# Altium footprint library ESKDPcbLib.PcbLib: 608 footprints (part 3 of 38)
Each footprint in its own frame and in the unit in brackets; x right, y up, seen from the top. Pads: shape width x height; smd on the part's side, far side on the other; paste and mask are expansions set on the pad; w line width, h text height; cw(c..) or ccw(c..) is an arc to the next point about the centre after c.
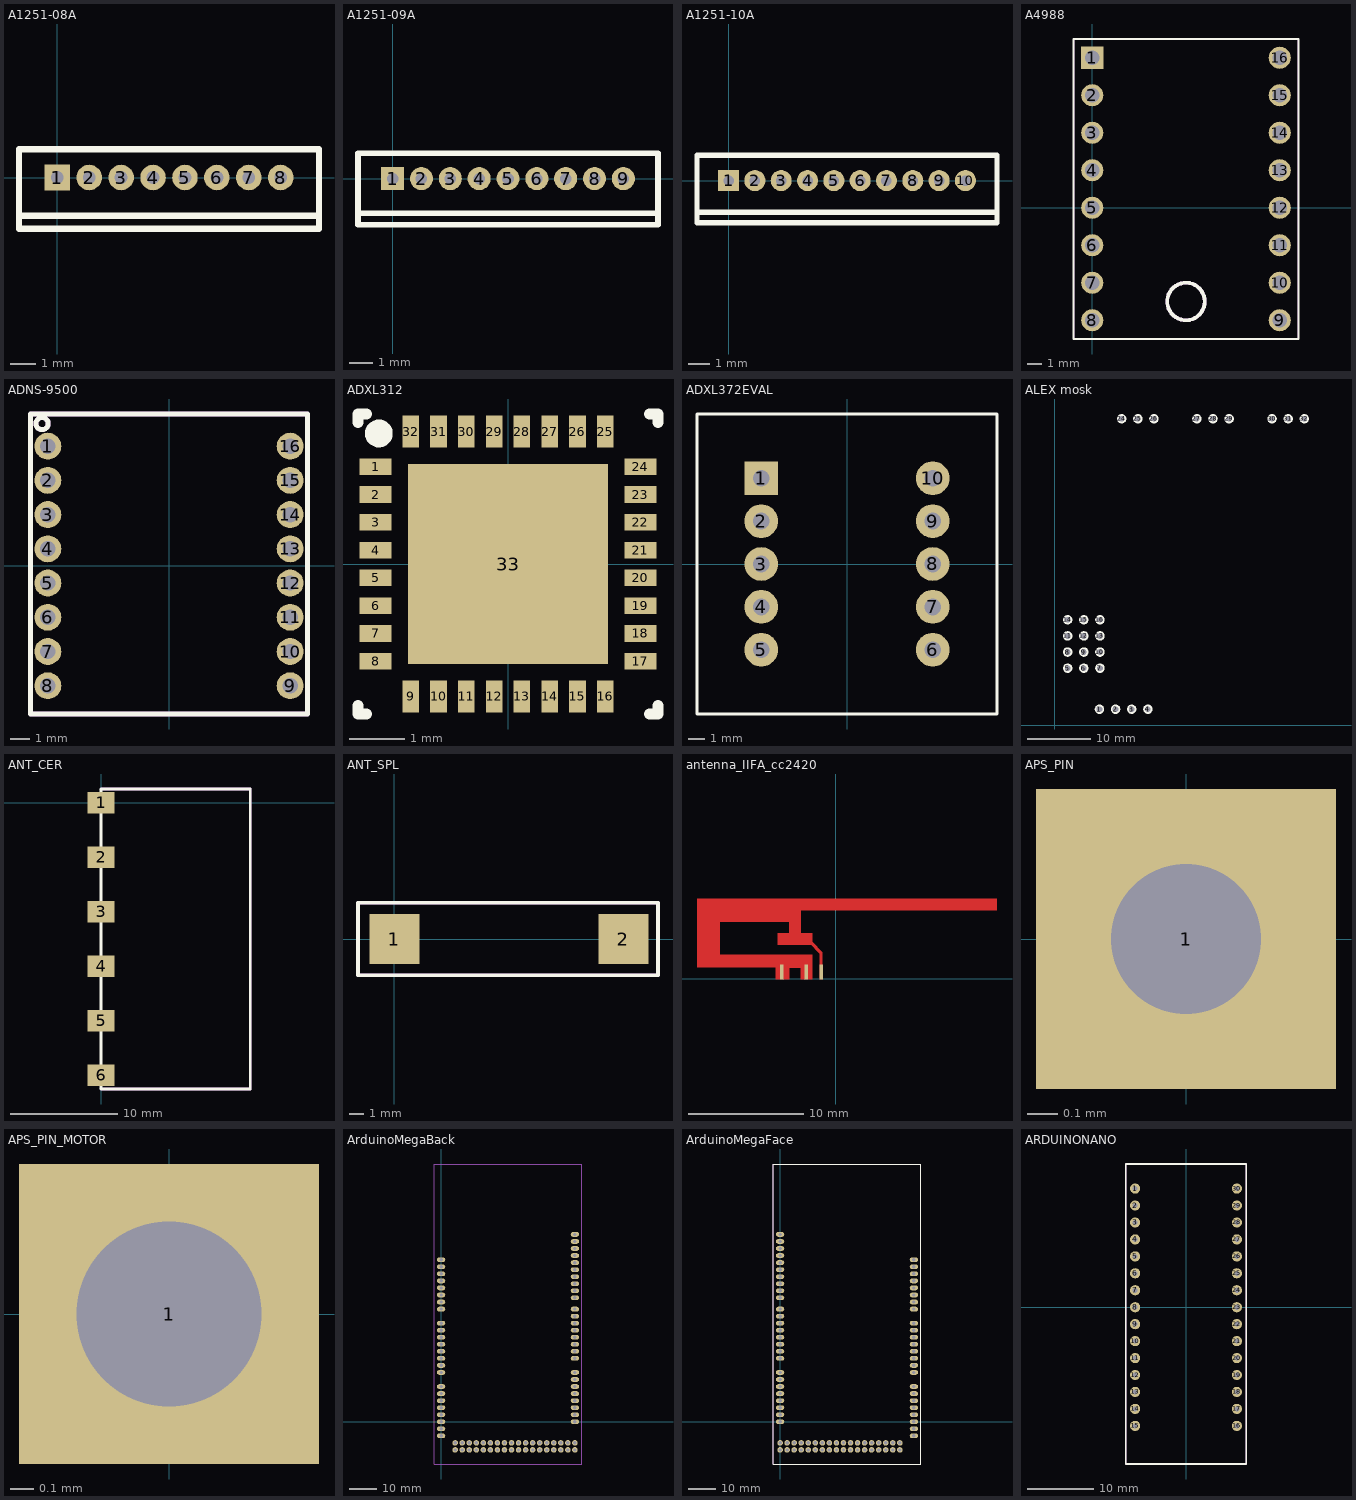
[diagram p2: the footprints below, top view; thin cyan lines are the x and y axes]

## A1251-08A [mm]
pads (8):
  rect 1x1 hole 0.5 mask+0: 1(0,0)
  round 1 hole 0.5 mask+0: 2(1.25,0) 3(2.5,0) 4(3.75,0) 5(5,0) 6(6.25,0) 7(7.5,0) 8(8.75,0)
Top Overlay:
  lines w0.254: -1.5,-1.5 10.2,-1.5 ; -1.5,-2 -1.5,1.1 10.25,1.1 10.25,-2 -1.5,-2
3D body: height 4.1, standoff -2.3, extent -1.475,-2.1 10.275,1.1

## A1251-09A [mm]
pads (9):
  rect 1x1 hole 0.5 mask+0: 1(0,0)
  round 1 hole 0.5 mask+0: 2(1.25,0) 3(2.5,0) 4(3.75,0) 5(5,0) 6(6.25,0) 7(7.5,0) 8(8.75,0) 9(10,0)
Top Overlay:
  lines w0.254: -1.5,-1.5 11.5,-1.5 ; -1.5,-2 11.5,-2 11.5,1.1 -1.5,1.1 -1.5,-2
3D body: height 4.1, standoff -2.3, extent -1.45,-2.125 11.55,1.075

## A1251-10A [mm]
pads (10):
  rect 1x1 hole 0.5 mask+0: 1(0,0)
  round 1 hole 0.5 mask+0: 2(1.25,0) 3(2.5,0) 4(3.75,0) 5(5,0) 6(6.25,0) 7(7.5,0) 8(8.75,0) 9(10,0) 10(11.25,0)
Top Overlay:
  lines w0.254: -1.5,-1.5 12.75,-1.5 ; -1.5,-2 12.75,-2 12.75,1.2 -1.5,1.2 -1.5,-2
3D body: height 4.1, standoff -2.3, extent -1.525,-2 12.725,1.2

## A4988 [mm]
pads (16):
  rect 1.5x1.5 hole 1: 1(0,10.16)
  round 1.5 hole 1: 2(0,7.62) 3(0,5.08) 4(0,2.54) 5(0,0) 6(0,-2.54) 7(0,-5.08) 8(0,-7.62) 9(12.7,-7.62) 10(12.7,-5.08) 11(12.7,-2.54) 12(12.7,0) 13(12.7,2.54) 14(12.7,5.08) 15(12.7,7.62) 16(12.7,10.16)
Top Overlay:
  circle w0.254: c6.35,-6.35 r1.27
  lines w0.15: -1.27,-8.89 13.97,-8.89 13.97,11.43 -1.27,11.43 -1.27,-8.89
Mechanical 7:
  circle w0.254: c6.35,-6.35 r1.27
  lines w0.1: -1.27,-8.89 13.97,-8.89 13.97,11.43 -1.27,11.43 -1.27,-8.89

## ADNS-9500 [mm] "Оптический датчик"
pads (16):
  round 1.4 hole 0.8: 1(-6.3,6.23) 2(-6.3,4.45) 3(-6.3,2.67) 4(-6.3,0.89) 5(-6.3,-0.89) 6(-6.3,-2.67) 7(-6.3,-4.45) 8(-6.3,-6.23) 9(6.3,-6.23) 10(6.3,-4.45) 11(6.3,-2.67) 12(6.3,-0.89) 13(6.3,0.89) 14(6.3,2.67) 15(6.3,4.45) 16(6.3,6.23)
Top Overlay:
  circle w0.254: c-6.6,7.4 r0.316
  lines w0.254: -7.2,-7.7 -7.2,7.9 7.2,7.9 7.2,-7.7 -7.2,-7.7
Mechanical 7:
  circle w0.254: c-6.6,7.4 r0.316
  lines w0.254: -7.2,-7.7 7.2,-7.7 7.2,7.9 -7.2,7.9 -7.2,-7.7
Mechanical 10:
  text ".Comment" at -5.5,9.8 h1.52
  text ".Designator" at -5.6,8.6 h1.52
3D body: height 4.5, standoff -1.45, extent -7.2,-7.7 7.2,7.9

## ADXL312 [mm] "QFN, 32-Leads, Body 5,3x5,3mm (max), Pitch 0,50mm, IPC Medium Density"
height 1.55
pads (33):
  rect 0.57x0.3 smd: 1(-2.385,1.75) 2(-2.385,1.25) 3(-2.385,0.75) 4(-2.385,0.25) 5(-2.385,-0.25) 6(-2.385,-0.75) 7(-2.385,-1.25) 8(-2.385,-1.75) 17(2.385,-1.75) 18(2.385,-1.25) 19(2.385,-0.75) 20(2.385,-0.25) 21(2.385,0.25) 22(2.385,0.75) 23(2.385,1.25) 24(2.385,1.75)
  rect 0.3x0.57 smd: 9(-1.75,-2.385) 10(-1.25,-2.385) 11(-0.75,-2.385) 12(-0.25,-2.385) 13(0.25,-2.385) 14(0.75,-2.385) 15(1.25,-2.385) 16(1.75,-2.385) 25(1.75,2.385) 26(1.25,2.385) 27(0.75,2.385) 28(0.25,2.385) 29(-0.25,2.385) 30(-0.75,2.385) 31(-1.25,2.385) 32(-1.75,2.385)
  rect 3.6x3.6 smd: 33(0,0)
Top Overlay:
  circle w0.25: c-2.325,2.35 r0.125
  lines w0.2: -2.7,-2.55 -2.7,-2.7 -2.55,-2.7 ; -2.7,2.55 -2.7,2.7 -2.55,2.7 ; 2.55,-2.7 2.7,-2.7 2.7,-2.55 ; 2.55,2.7 2.7,2.7 2.7,2.55
Mechanical 15:
  lines w0.1: -0.5,0 0.5,0 ; 0,-0.5 0,0.5
3D body: height 1.55, standoff 0.05, extent -2.5,-2.5 2.5,2.5

## ADXL372EVAL [mm]
pads (10):
  rect 2x2 hole 1: 1(-5.08,5.08)
  round 2 hole 1: 2(-5.08,2.54) 3(-5.08,0) 4(-5.08,-2.54) 5(-5.08,-5.08) 6(5.08,-5.08) 7(5.08,-2.54) 8(5.08,0) 9(5.08,2.54) 10(5.08,5.08)
Top Overlay:
  lines w0.15: -8.89,-8.89 -8.89,8.89 8.89,8.89 8.89,-8.89 -8.89,-8.89
Mechanical 7:
  lines w0.1: -8.89,-8.89 8.89,-8.89 8.89,8.89 -8.89,8.89 -8.89,-8.89
Mechanical 10:
  text ".Designator" at -8.89,11.43 h1
  text ".Comment" at -8.89,10.16 h1
3D body "PLS-1.STEP": height 8.44, standoff -3, extent -6.35,-1.27 -3.81,1.27
3D body "PLS-1.STEP": height 8.44, standoff -3, extent -6.35,1.27 -3.81,3.81
3D body "PLS-1.STEP": height 8.44, standoff -3, extent -6.35,3.81 -3.81,6.35
3D body "PLS-1.STEP": height 8.44, standoff -3, extent -6.35,-3.81 -3.81,-1.27
3D body "PLS-1.STEP": height 8.44, standoff -3, extent 3.81,-3.81 6.35,-1.27
3D body "PLS-1.STEP": height 8.44, standoff -3, extent 3.81,-6.35 6.35,-3.81
3D body "PLS-1.STEP": height 8.44, standoff -3, extent -6.35,-6.35 -3.81,-3.81
3D body "PLS-1.STEP": height 8.44, standoff -3, extent 3.81,-1.27 6.35,1.27
3D body "PLS-1.STEP": height 8.44, standoff -3, extent 3.81,1.27 6.35,3.81
3D body "PLS-1.STEP": height 8.44, standoff -3, extent 3.81,3.81 6.35,6.35

## ALEX mosk [mm]
pads (25):
  round 1.5 on Top Overlay hole 0.9 unplated mask+0.1: 1(7,2.54) 2(9.54,2.54) 3(12.08,2.54) 4(14.62,2.54) 5(2,9) 6(4.54,9) 7(7.08,9) 8(2,11.54) 9(4.54,11.54) 10(7.08,11.54) 11(2,14.08) 12(4.54,14.08) 13(7.08,14.08) 14(2,16.62) 15(4.54,16.62) 16(7.08,16.62) 24(10.5,48.25) 25(13.04,48.25) 26(15.58,48.25) 27(22.33,48.25) 28(24.87,48.25) 29(27.41,48.25) 30(34.16,48.25) 31(36.7,48.25) 32(39.24,48.25)
3D body: height -0.95, standoff -11.75, extent -38,-1.5 50.4,51.6

## ANT_CER [mm]
pads (6):
  rect 2.5x2 smd: 1(0,0) 2(0,-5.1) 3(0,-10.2) 4(0,-15.3) 5(0,-20.4) 6(0,-25.5)
Top Overlay:
  lines w0.254: 0,-26.77 0,1.297 13.97,1.297 13.97,-26.77 0,-26.77
Mechanical 7:
  lines w0.254: 0,-26.77 13.97,-26.77 13.97,1.297 0,1.297

## ANT_SPL [mm]
pads (2):
  rect 3.5x3.5 smd: 1(0,0) 2(16,0)
Top Overlay:
  lines w0.254: -2.54,-2.54 -2.54,2.54 18.415,2.54 18.415,-2.54 -2.54,-2.54
Mechanical 7:
  lines w0.254: -2.54,-2.54 -2.54,2.54 18.415,2.54 18.415,-2.54 -2.54,-2.54

## antenna_IIFA_cc2420 [mm]
pads (3):
  rect 0.3x1.3 smd paste-0.3 mask-0.3: 1(-1.27,0.584) 2(-2.565,0.584) 3(-4.674,0.584)
Top Layer:
  region: -2.03,-0.076 -3.03,-0.076 -3.03,0.924 -4.03,0.924 -4.03,-0.076 -5.18,-0.076 -5.18,0.991 -12.012,0.991 -12.012,6.924 13.97,6.924 13.97,5.924 -3.03,5.924 -3.03,3.924 -2.03,3.924 -2.03,2.924 -5.03,2.924 -5.03,3.924 -4.03,3.924 -4.03,4.924 -10.03,4.924 -10.03,2.057 -2.03,2.057
  region: -1.143,-0.076 -1.397,-0.076 -1.397,2.147 -1.143,2.147
  region: -1.397,2.134 -1.422,2.21 -2.261,3.048 -2.032,3.175 -1.143,2.286 -1.143,2.134

## APS_PIN [mm]
pads (1):
  rect 1x1 hole 0.5 mask+0: 1(0,0)

## APS_PIN_MOTOR [mm]
pads (1):
  rect 1.3x1.3 hole 0.8 mask+0: 1(0,0)

## ArduinoMegaBack [mm]
pads (86):
  oval 3x1.7 hole 1.2: 1(48.26,67.564) 2(48.26,65.024) 3(48.26,62.484) 4(48.26,59.944) 5(48.26,57.404) 6(48.26,54.864) 7(48.26,52.324) 8(48.26,49.784) 9(48.26,47.244) 10(48.26,44.704) 11(48.26,40.64) 12(48.26,38.1) 13(48.26,35.56) 14(48.26,33.02) 15(48.26,30.48) 16(48.26,27.94) 17(48.26,25.4) 18(48.26,22.86) 19(48.26,17.78) 20(48.26,15.24) 21(48.26,12.7) 22(48.26,10.16) 23(48.26,7.62) 24(48.26,5.08) 25(48.26,2.54) 26(48.26,0) 63(0,-5.08) 64(0,-2.54) 65(0,0) 66(0,2.54) 67(0,5.08) 68(0,7.62) 69(0,10.16) 70(0,12.7) 71(0,17.78) 72(0,20.32) 73(0,22.86) 74(0,25.4) 75(0,27.94) 76(0,30.48) 77(0,33.02) 78(0,35.56) 79(0,40.64) 80(0,43.18) 81(0,45.72) 82(0,48.26) 83(0,50.8) 84(0,53.34) 85(0,55.88) ""(0,58.42)
  round 2 hole 1.2: 27(48.26,-7.62) 28(48.26,-10.16) 29(45.72,-7.62) 30(45.72,-10.16) 31(43.18,-7.62) 32(43.18,-10.16) 33(40.64,-7.62) 34(40.64,-10.16) 35(38.1,-7.62) 36(38.1,-10.16) 37(35.56,-7.62) 38(35.56,-10.16) 39(33.02,-7.62) 40(33.02,-10.16) 41(30.48,-7.62) 42(30.48,-10.16) 43(27.94,-7.62) 44(27.94,-10.16) 45(25.4,-7.62) 46(25.4,-10.16) 47(22.86,-7.62) 48(22.86,-10.16) 49(20.32,-7.62) 50(20.32,-10.16) 51(17.78,-7.62) 52(17.78,-10.16) 53(15.24,-7.62) 54(15.24,-10.16) 55(12.7,-7.62) 56(12.7,-10.16) 57(10.16,-7.62) 58(10.16,-10.16) 59(7.62,-7.62) 60(7.62,-10.16) 61(5.08,-7.62) 62(5.08,-10.16)
Bottom Overlay:
  lines w0.254: -2.54,-15.24 -2.54,92.964 50.8,92.964 50.8,-15.24 -2.54,-15.24
Mechanical 7:
  lines w0.254: -2.54,-15.24 50.8,-15.24 50.8,92.964 -2.54,92.964 -2.54,-15.24
Mechanical 10:
  text ".Comment" at 18.005,95.074 h1
  text ".Designator" at 18.005,96.074 h1
3D body "PLS-1.STEP": height 2.7, standoff -8.74, extent 46.99,66.294 49.53,68.834
3D body "ARDUINO_MEGA_2560.STEP": height 25.65, standoff 10.4, extent -2.54,-15.24 50.8,92.71
3D body "PLS-1.STEP": height 2.7, standoff -8.74, extent 46.99,63.754 49.53,66.294
3D body "PLS-1.STEP": height 2.7, standoff -8.74, extent 46.99,61.214 49.53,63.754
3D body "PLS-1.STEP": height 2.7, standoff -8.74, extent 46.99,58.674 49.53,61.214
3D body "PLS-1.STEP": height 2.7, standoff -8.74, extent 46.99,56.134 49.53,58.674
3D body "PLS-1.STEP": height 2.7, standoff -8.74, extent 46.99,53.594 49.53,56.134
3D body "PLS-1.STEP": height 2.7, standoff -8.74, extent 46.99,51.054 49.53,53.594
3D body "PLS-1.STEP": height 2.7, standoff -8.74, extent 46.99,48.514 49.53,51.054
3D body "PLS-1.STEP": height 2.7, standoff -8.74, extent 46.99,45.974 49.53,48.514
3D body "PLS-1.STEP": height 2.7, standoff -8.74, extent 46.99,43.434 49.53,45.974
3D body "PLS-1.STEP": height 2.7, standoff -8.74, extent -1.27,39.37 1.27,41.91
3D body "PLS-1.STEP": height 2.7, standoff -8.74, extent -1.27,41.91 1.27,44.45
3D body "PLS-1.STEP": height 2.7, standoff -8.74, extent -1.27,44.45 1.27,46.99
3D body "PLS-1.STEP": height 2.7, standoff -8.74, extent -1.27,46.99 1.27,49.53
3D body "PLS-1.STEP": height 2.7, standoff -8.74, extent -1.27,49.53 1.27,52.07
3D body "PLS-1.STEP": height 2.7, standoff -8.74, extent -1.27,52.07 1.27,54.61
3D body "PLS-1.STEP": height 2.7, standoff -8.74, extent -1.27,54.61 1.27,57.15
3D body "PLS-1.STEP": height 2.7, standoff -8.74, extent -1.27,57.15 1.27,59.69
3D body "PLS-1.STEP": height 2.7, standoff -8.74, extent -1.27,34.29 1.27,36.83
3D body "PLS-1.STEP": height 2.7, standoff -8.74, extent -1.27,31.75 1.27,34.29
3D body "PLS-1.STEP": height 2.7, standoff -8.74, extent -1.27,29.21 1.27,31.75
3D body "PLS-1.STEP": height 2.7, standoff -8.74, extent -1.27,26.67 1.27,29.21
3D body "PLS-1.STEP": height 2.7, standoff -8.74, extent -1.27,24.13 1.27,26.67
3D body "PLS-1.STEP": height 2.7, standoff -8.74, extent -1.27,21.59 1.27,24.13
3D body "PLS-1.STEP": height 2.7, standoff -8.74, extent -1.27,19.05 1.27,21.59
3D body "PLS-1.STEP": height 2.7, standoff -8.74, extent -1.27,16.51 1.27,19.05
3D body "PLS-1.STEP": height 2.7, standoff -8.74, extent -1.27,11.43 1.27,13.97
3D body "PLS-1.STEP": height 2.7, standoff -8.74, extent -1.27,8.89 1.27,11.43
3D body "PLS-1.STEP": height 2.7, standoff -8.74, extent -1.27,6.35 1.27,8.89
3D body "PLS-1.STEP": height 2.7, standoff -8.74, extent -1.27,3.81 1.27,6.35
3D body "PLS-1.STEP": height 2.7, standoff -8.74, extent -1.27,1.27 1.27,3.81
3D body "PLS-1.STEP": height 2.7, standoff -8.74, extent -1.27,-1.27 1.27,1.27
3D body "PLS-1.STEP": height 2.7, standoff -8.74, extent -1.27,-3.81 1.27,-1.27
3D body "PLS-1.STEP": height 2.7, standoff -8.74, extent -1.27,-6.35 1.27,-3.81
3D body "PLS-1.STEP": height 2.7, standoff -8.74, extent 3.81,-8.89 6.35,-6.35
3D body "PLS-1.STEP": height 2.7, standoff -8.74, extent 6.35,-8.89 8.89,-6.35
3D body "PLS-1.STEP": height 2.7, standoff -8.74, extent 8.89,-8.89 11.43,-6.35
3D body "PLS-1.STEP": height 2.7, standoff -8.74, extent 11.43,-8.89 13.97,-6.35
3D body "PLS-1.STEP": height 2.7, standoff -8.74, extent 13.97,-8.89 16.51,-6.35
3D body "PLS-1.STEP": height 2.7, standoff -8.74, extent 16.51,-8.89 19.05,-6.35
3D body "PLS-1.STEP": height 2.7, standoff -8.74, extent 19.05,-8.89 21.59,-6.35
3D body "PLS-1.STEP": height 2.7, standoff -8.74, extent 21.59,-8.89 24.13,-6.35
3D body "PLS-1.STEP": height 2.7, standoff -8.74, extent 3.81,-11.43 6.35,-8.89
3D body "PLS-1.STEP": height 2.7, standoff -8.74, extent 6.35,-11.43 8.89,-8.89
3D body "PLS-1.STEP": height 2.7, standoff -8.74, extent 8.89,-11.43 11.43,-8.89
3D body "PLS-1.STEP": height 2.7, standoff -8.74, extent 11.43,-11.43 13.97,-8.89
3D body "PLS-1.STEP": height 2.7, standoff -8.74, extent 13.97,-11.43 16.51,-8.89
3D body "PLS-1.STEP": height 2.7, standoff -8.74, extent 16.51,-11.43 19.05,-8.89
3D body "PLS-1.STEP": height 2.7, standoff -8.74, extent 19.05,-11.43 21.59,-8.89
3D body "PLS-1.STEP": height 2.7, standoff -8.74, extent 21.59,-11.43 24.13,-8.89
3D body "PLS-1.STEP": height 2.7, standoff -8.74, extent 24.13,-8.89 26.67,-6.35
3D body "PLS-1.STEP": height 2.7, standoff -8.74, extent 26.67,-8.89 29.21,-6.35
3D body "PLS-1.STEP": height 2.7, standoff -8.74, extent 29.21,-8.89 31.75,-6.35
3D body "PLS-1.STEP": height 2.7, standoff -8.74, extent 31.75,-8.89 34.29,-6.35
3D body "PLS-1.STEP": height 2.7, standoff -8.74, extent 34.29,-8.89 36.83,-6.35
3D body "PLS-1.STEP": height 2.7, standoff -8.74, extent 36.83,-8.89 39.37,-6.35
3D body "PLS-1.STEP": height 2.7, standoff -8.74, extent 39.37,-8.89 41.91,-6.35
3D body "PLS-1.STEP": height 2.7, standoff -8.74, extent 41.91,-8.89 44.45,-6.35
3D body "PLS-1.STEP": height 2.7, standoff -8.74, extent 24.13,-11.43 26.67,-8.89
3D body "PLS-1.STEP": height 2.7, standoff -8.74, extent 26.67,-11.43 29.21,-8.89
3D body "PLS-1.STEP": height 2.7, standoff -8.74, extent 29.21,-11.43 31.75,-8.89
3D body "PLS-1.STEP": height 2.7, standoff -8.74, extent 31.75,-11.43 34.29,-8.89
3D body "PLS-1.STEP": height 2.7, standoff -8.74, extent 34.29,-11.43 36.83,-8.89
3D body "PLS-1.STEP": height 2.7, standoff -8.74, extent 36.83,-11.43 39.37,-8.89
3D body "PLS-1.STEP": height 2.7, standoff -8.74, extent 39.37,-11.43 41.91,-8.89
3D body "PLS-1.STEP": height 2.7, standoff -8.74, extent 41.91,-11.43 44.45,-8.89
3D body "PLS-1.STEP": height 2.7, standoff -8.74, extent 46.99,-1.27 49.53,1.27
3D body "PLS-1.STEP": height 2.7, standoff -8.74, extent 46.99,1.27 49.53,3.81
3D body "PLS-1.STEP": height 2.7, standoff -8.74, extent 46.99,3.81 49.53,6.35
3D body "PLS-1.STEP": height 2.7, standoff -8.74, extent 46.99,6.35 49.53,8.89
3D body "PLS-1.STEP": height 2.7, standoff -8.74, extent 46.99,8.89 49.53,11.43
3D body "PLS-1.STEP": height 2.7, standoff -8.74, extent 46.99,11.43 49.53,13.97
3D body "PLS-1.STEP": height 2.7, standoff -8.74, extent 46.99,13.97 49.53,16.51
3D body "PLS-1.STEP": height 2.7, standoff -8.74, extent 46.99,16.51 49.53,19.05
3D body "PLS-1.STEP": height 2.7, standoff -8.74, extent 46.99,21.59 49.53,24.13
3D body "PLS-1.STEP": height 2.7, standoff -8.74, extent 46.99,24.13 49.53,26.67
3D body "PLS-1.STEP": height 2.7, standoff -8.74, extent 46.99,26.67 49.53,29.21
3D body "PLS-1.STEP": height 2.7, standoff -8.74, extent 46.99,29.21 49.53,31.75
3D body "PLS-1.STEP": height 2.7, standoff -8.74, extent 46.99,31.75 49.53,34.29
3D body "PLS-1.STEP": height 2.7, standoff -8.74, extent 46.99,34.29 49.53,36.83
3D body "PLS-1.STEP": height 2.7, standoff -8.74, extent 46.99,36.83 49.53,39.37
3D body "PLS-1.STEP": height 2.7, standoff -8.74, extent 46.99,39.37 49.53,41.91
3D body "PLS-1.STEP": height 2.7, standoff -8.74, extent 46.99,-11.43 49.53,-8.89
3D body "PLS-1.STEP": height 2.7, standoff -8.74, extent 46.99,-8.89 49.53,-6.35
3D body "PLS-1.STEP": height 2.7, standoff -8.74, extent 44.45,-11.43 46.99,-8.89
3D body "PLS-1.STEP": height 2.7, standoff -8.74, extent 44.45,-8.89 46.99,-6.35

## ArduinoMegaFace [mm]
pads (86):
  oval 3x1.7 hole 1.2: 1(0,67.564) 2(0,65.024) 3(0,62.484) 4(0,59.944) 5(0,57.404) 6(0,54.864) 7(0,52.324) 8(0,49.784) 9(0,47.244) 10(0,44.704) 11(0,40.64) 12(0,38.1) 13(0,35.56) 14(0,33.02) 15(0,30.48) 16(0,27.94) 17(0,25.4) 18(0,22.86) 19(0,17.78) 20(0,15.24) 21(0,12.7) 22(0,10.16) 23(0,7.62) 24(0,5.08) 25(0,2.54) 26(0,0) 63(48.26,-5.08) 64(48.26,-2.54) 65(48.26,0) 66(48.26,2.54) 67(48.26,5.08) 68(48.26,7.62) 69(48.26,10.16) 70(48.26,12.7) 71(48.26,17.78) 72(48.26,20.32) 73(48.26,22.86) 74(48.26,25.4) 75(48.26,27.94) 76(48.26,30.48) 77(48.26,33.02) 78(48.26,35.56) 79(48.26,40.64) 80(48.26,43.18) 81(48.26,45.72) 82(48.26,48.26) 83(48.26,50.8) 84(48.26,53.34) 85(48.26,55.88) ""(48.26,58.42)
  round 2 hole 1.2: 27(0,-7.62) 28(0,-10.16) 29(2.54,-7.62) 30(2.54,-10.16) 31(5.08,-7.62) 32(5.08,-10.16) 33(7.62,-7.62) 34(7.62,-10.16) 35(10.16,-7.62) 36(10.16,-10.16) 37(12.7,-7.62) 38(12.7,-10.16) 39(15.24,-7.62) 40(15.24,-10.16) 41(17.78,-7.62) 42(17.78,-10.16) 43(20.32,-7.62) 44(20.32,-10.16) 45(22.86,-7.62) 46(22.86,-10.16) 47(25.4,-7.62) 48(25.4,-10.16) 49(27.94,-7.62) 50(27.94,-10.16) 51(30.48,-7.62) 52(30.48,-10.16) 53(33.02,-7.62) 54(33.02,-10.16) 55(35.56,-7.62) 56(35.56,-10.16) 57(38.1,-7.62) 58(38.1,-10.16) 59(40.64,-7.62) 60(40.64,-10.16) 61(43.18,-7.62) 62(43.18,-10.16)
Top Overlay:
  lines w0.254: -2.54,-15.24 -2.54,92.964 50.8,92.964 50.8,-15.24 -2.54,-15.24
Mechanical 7:
  lines w0.254: -2.54,-15.24 50.8,-15.24 50.8,92.964 -2.54,92.964 -2.54,-15.24
Mechanical 10:
  text ".Comment" at 30.255,95.074 h1
  text ".Designator" at 30.255,96.074 h1
3D body "PLS-1.STEP": height 8.44, standoff -3, extent -1.27,-1.27 1.27,1.27
3D body "PLS-1.STEP": height 8.44, standoff -3, extent -1.27,1.27 1.27,3.81
3D body "PLS-1.STEP": height 8.44, standoff -3, extent -1.27,3.81 1.27,6.35
3D body "PLS-1.STEP": height 8.44, standoff -3, extent -1.27,6.35 1.27,8.89
3D body "PLS-1.STEP": height 8.44, standoff -3, extent -1.27,8.89 1.27,11.43
3D body "PLS-1.STEP": height 8.44, standoff -3, extent -1.27,11.43 1.27,13.97
3D body "PLS-1.STEP": height 8.44, standoff -3, extent -1.27,13.97 1.27,16.51
3D body "PLS-1.STEP": height 8.44, standoff -3, extent -1.27,16.51 1.27,19.05
3D body "PLS-1.STEP": height 8.44, standoff -3, extent -1.27,39.37 1.27,41.91
3D body "PLS-1.STEP": height 8.44, standoff -3, extent -1.27,36.83 1.27,39.37
3D body "PLS-1.STEP": height 8.44, standoff -3, extent -1.27,34.29 1.27,36.83
3D body "PLS-1.STEP": height 8.44, standoff -3, extent -1.27,31.75 1.27,34.29
3D body "PLS-1.STEP": height 8.44, standoff -3, extent -1.27,29.21 1.27,31.75
3D body "PLS-1.STEP": height 8.44, standoff -3, extent -1.27,26.67 1.27,29.21
3D body "PLS-1.STEP": height 8.44, standoff -3, extent -1.27,24.13 1.27,26.67
3D body "PLS-1.STEP": height 8.44, standoff -3, extent -1.27,21.59 1.27,24.13
3D body "PLS-1.STEP": height 8.44, standoff -3, extent 46.99,57.15 49.53,59.69
3D body "PLS-1.STEP": height 8.44, standoff -3, extent 46.99,54.61 49.53,57.15
3D body "PLS-1.STEP": height 8.44, standoff -3, extent 46.99,52.07 49.53,54.61
3D body "PLS-1.STEP": height 8.44, standoff -3, extent 46.99,49.53 49.53,52.07
3D body "PLS-1.STEP": height 8.44, standoff -3, extent 46.99,46.99 49.53,49.53
3D body "PLS-1.STEP": height 8.44, standoff -3, extent 46.99,44.45 49.53,46.99
3D body "PLS-1.STEP": height 8.44, standoff -3, extent 46.99,41.91 49.53,44.45
3D body "PLS-1.STEP": height 8.44, standoff -3, extent 46.99,39.37 49.53,41.91
3D body "PLS-1.STEP": height 8.44, standoff -3, extent 46.99,34.29 49.53,36.83
3D body "PLS-1.STEP": height 8.44, standoff -3, extent 46.99,31.75 49.53,34.29
3D body "PLS-1.STEP": height 8.44, standoff -3, extent 46.99,29.21 49.53,31.75
3D body "PLS-1.STEP": height 8.44, standoff -3, extent 46.99,26.67 49.53,29.21
3D body "PLS-1.STEP": height 8.44, standoff -3, extent 46.99,24.13 49.53,26.67
3D body "PLS-1.STEP": height 8.44, standoff -3, extent 46.99,21.59 49.53,24.13
3D body "PLS-1.STEP": height 8.44, standoff -3, extent 46.99,19.05 49.53,21.59
3D body "PLS-1.STEP": height 8.44, standoff -3, extent 46.99,16.51 49.53,19.05
3D body "PLS-1.STEP": height 8.44, standoff -3, extent 46.99,11.43 49.53,13.97
3D body "PLS-1.STEP": height 8.44, standoff -3, extent 46.99,8.89 49.53,11.43
3D body "PLS-1.STEP": height 8.44, standoff -3, extent 46.99,6.35 49.53,8.89
3D body "PLS-1.STEP": height 8.44, standoff -3, extent 46.99,3.81 49.53,6.35
3D body "PLS-1.STEP": height 8.44, standoff -3, extent 46.99,1.27 49.53,3.81
3D body "PLS-1.STEP": height 8.44, standoff -3, extent 46.99,-1.27 49.53,1.27
3D body "PLS-1.STEP": height 8.44, standoff -3, extent 46.99,-3.81 49.53,-1.27
3D body "PLS-1.STEP": height 8.44, standoff -3, extent 46.99,-6.35 49.53,-3.81
3D body "PLS-1.STEP": height 8.44, standoff -3, extent -1.27,-8.89 1.27,-6.35
3D body "PLS-1.STEP": height 8.44, standoff -3, extent 1.27,-8.89 3.81,-6.35
3D body "PLS-1.STEP": height 8.44, standoff -3, extent 3.81,-8.89 6.35,-6.35
3D body "PLS-1.STEP": height 8.44, standoff -3, extent 6.35,-8.89 8.89,-6.35
3D body "PLS-1.STEP": height 8.44, standoff -3, extent 8.89,-8.89 11.43,-6.35
3D body "PLS-1.STEP": height 8.44, standoff -3, extent 11.43,-8.89 13.97,-6.35
3D body "PLS-1.STEP": height 8.44, standoff -3, extent 13.97,-8.89 16.51,-6.35
3D body "PLS-1.STEP": height 8.44, standoff -3, extent 16.51,-8.89 19.05,-6.35
3D body "PLS-1.STEP": height 8.44, standoff -3, extent -1.27,-11.43 1.27,-8.89
3D body "PLS-1.STEP": height 8.44, standoff -3, extent 1.27,-11.43 3.81,-8.89
3D body "PLS-1.STEP": height 8.44, standoff -3, extent 3.81,-11.43 6.35,-8.89
3D body "PLS-1.STEP": height 8.44, standoff -3, extent 6.35,-11.43 8.89,-8.89
3D body "PLS-1.STEP": height 8.44, standoff -3, extent 8.89,-11.43 11.43,-8.89
3D body "PLS-1.STEP": height 8.44, standoff -3, extent 11.43,-11.43 13.97,-8.89
3D body "PLS-1.STEP": height 8.44, standoff -3, extent 13.97,-11.43 16.51,-8.89
3D body "PLS-1.STEP": height 8.44, standoff -3, extent 16.51,-11.43 19.05,-8.89
3D body "PLS-1.STEP": height 8.44, standoff -3, extent 19.05,-8.89 21.59,-6.35
3D body "PLS-1.STEP": height 8.44, standoff -3, extent 21.59,-8.89 24.13,-6.35
3D body "PLS-1.STEP": height 8.44, standoff -3, extent 24.13,-8.89 26.67,-6.35
3D body "PLS-1.STEP": height 8.44, standoff -3, extent 26.67,-8.89 29.21,-6.35
3D body "PLS-1.STEP": height 8.44, standoff -3, extent 29.21,-8.89 31.75,-6.35
3D body "PLS-1.STEP": height 8.44, standoff -3, extent 31.75,-8.89 34.29,-6.35
3D body "PLS-1.STEP": height 8.44, standoff -3, extent 34.29,-8.89 36.83,-6.35
3D body "PLS-1.STEP": height 8.44, standoff -3, extent 36.83,-8.89 39.37,-6.35
3D body "PLS-1.STEP": height 8.44, standoff -3, extent 19.05,-11.43 21.59,-8.89
3D body "PLS-1.STEP": height 8.44, standoff -3, extent 21.59,-11.43 24.13,-8.89
3D body "PLS-1.STEP": height 8.44, standoff -3, extent 24.13,-11.43 26.67,-8.89
3D body "PLS-1.STEP": height 8.44, standoff -3, extent 26.67,-11.43 29.21,-8.89
3D body "PLS-1.STEP": height 8.44, standoff -3, extent 29.21,-11.43 31.75,-8.89
3D body "PLS-1.STEP": height 8.44, standoff -3, extent 31.75,-11.43 34.29,-8.89
3D body "PLS-1.STEP": height 8.44, standoff -3, extent 34.29,-11.43 36.83,-8.89
3D body "PLS-1.STEP": height 8.44, standoff -3, extent 36.83,-11.43 39.37,-8.89
3D body "PLS-1.STEP": height 8.44, standoff -3, extent 41.91,-11.43 44.45,-8.89
3D body "PLS-1.STEP": height 8.44, standoff -3, extent 41.91,-8.89 44.45,-6.35
3D body "PLS-1.STEP": height 8.44, standoff -3, extent 39.37,-11.43 41.91,-8.89
3D body "PLS-1.STEP": height 8.44, standoff -3, extent 39.37,-8.89 41.91,-6.35
3D body "PLS-1.STEP": height 8.44, standoff -3, extent -1.27,43.434 1.27,45.974
3D body "PLS-1.STEP": height 8.44, standoff -3, extent -1.27,45.974 1.27,48.514
3D body "PLS-1.STEP": height 8.44, standoff -3, extent -1.27,48.514 1.27,51.054
3D body "PLS-1.STEP": height 8.44, standoff -3, extent -1.27,51.054 1.27,53.594
3D body "PLS-1.STEP": height 8.44, standoff -3, extent -1.27,53.594 1.27,56.134
3D body "PLS-1.STEP": height 8.44, standoff -3, extent -1.27,56.134 1.27,58.674
3D body "PLS-1.STEP": height 8.44, standoff -3, extent -1.27,58.674 1.27,61.214
3D body "PLS-1.STEP": height 8.44, standoff -3, extent -1.27,61.214 1.27,63.754
3D body "PLS-1.STEP": height 8.44, standoff -3, extent -1.27,63.754 1.27,66.294
3D body "PLS-1.STEP": height 8.44, standoff -3, extent -1.27,66.294 1.27,68.834
3D body "ARDUINO_MEGA_2560.STEP": height 15.6, standoff 0.35, extent -2.54,-15.24 50.8,92.71

## ARDUINONANO [mil]
pads (30):
  round 60 hole 30: 1(-300,700) 2(-300,600) 3(-300,500) 4(-300,400) 5(-300,300) 6(-300,200) 7(-300,100) 8(-300,0) 9(-300,-100) 10(-300,-200) 11(-300,-300) 12(-300,-400) 13(-300,-500) 14(-300,-600) 15(-300,-700) 16(300,-700) 17(300,-600) 18(300,-500) 19(300,-400) 20(300,-300) 21(300,-200) 22(300,-100) 23(300,0) 24(300,100) 25(300,200) 26(300,300) 27(300,400) 28(300,500) 29(300,600) 30(300,700)
Top Overlay:
  lines w10: -355,-925 355,-925 355,845 -355,845 -355,-925
Mechanical 7:
  lines w10: -355,-925 355,-925 355,845 -355,845 -355,-925
Mechanical 10:
  text ".Comment" at 118.11,866.14 h39.37
  text ".Designator" at 118.11,905.51 h39.37
3D body "arduino_nano.STEP": height 515.75, standoff -216.54, extent -355,-925.83 353.66,845.83